# Altium schematic symbol library AA_Symbols.SchLib: 1017 symbols (part 7 of 7)
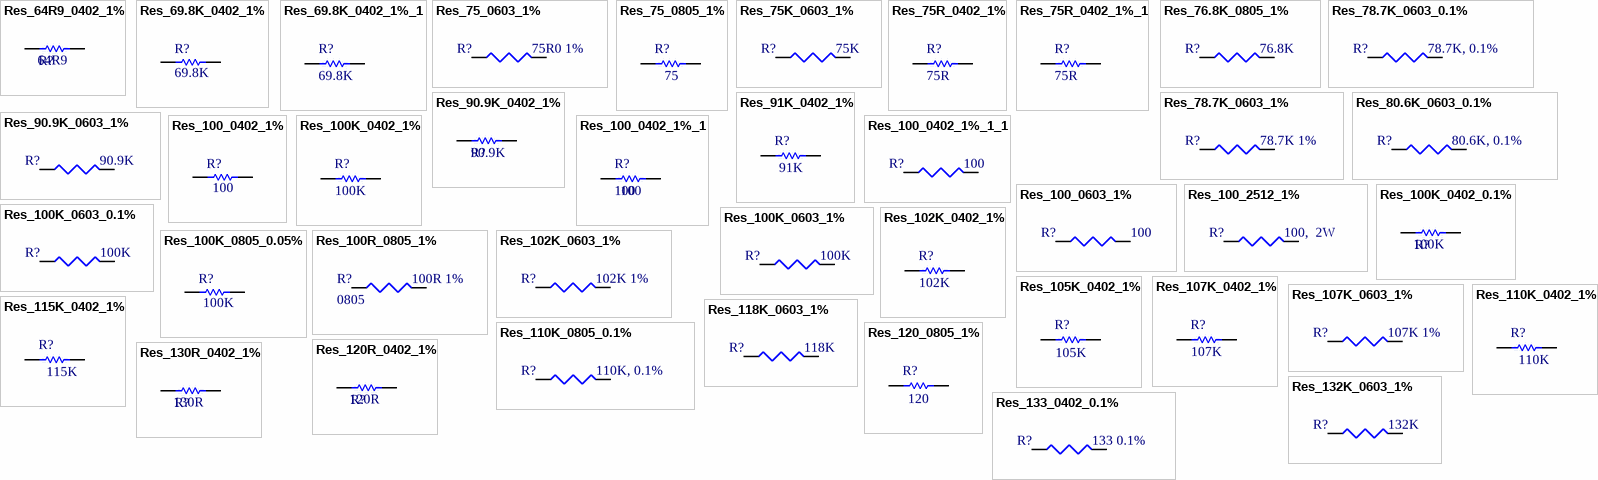
[diagram p48: symbols Res_64R9_0402_1% to Res_133_0402_0.1%]

## Res_118K_0603_1%
designator R?, comment 118K
Resistor, 118K, 0603, 1%; Manufacturer: Stackpole Electronics Inc; Manufacturer P/N: RMCF0603FT118K; Outset P/N: 0000243; Value: 118K
footprint RC_1608_0603_N
pins: 1, 2

## Res_120_0805_1%
designator R?, comment 120
Resistor, 120, 0805, 1%, 1/8W; Manufacturer P/N: ERJ-6ENF1200V; Manufacturer: Panasonic-ECG; Outset P/N: PN-0007121; TempCo: 100ppm/C; TOLERANCE: 1%; POWER: 1/8W; Value: 120
footprint RC_2012_0805_N
footprint RC_2012_0805_L
pins: 1, 2

## Res_120R_0402_1%
designator R?, comment 120R
Resistor, 120R, 0402, 1%, 1/16W; Manufacturer P/N: RC0402FR-07120RL; Manufacturer: Yageo; Outset P/N: PN-0008204; TempCo: 100ppm/C; TOLERANCE: 1%; POWER: 1/16W; Supplier 1: Digi-Key; Supplier Part Number 1: 311-120LRTR-ND; Value: 120R
footprint RC_1005_0402_L
pins: 1, 2

## Res_130R_0402_1%
designator R?, comment 130R
Resistor, 130R, 0402, 1%, 1/16W; Manufacturer P/N: RC0402FR-07130RL; Manufacturer: Yageo; Outset P/N: PN-0008205; TempCo: 100ppm/C; TOLERANCE: 1%; POWER: 1/16W; Supplier 1: Digi-Key; Supplier Part Number 1: 311-130LRTR-ND; Value: 130R
footprint RC_1005_0402_L
pins: 1, 2

## Res_132K_0603_1%
designator R?, comment 132K
Resistor, 132K, 0603, 1%; Manufacturer: Yageo; Manufacturer P/N: RT0603DRE07132KL; Outset P/N: PN-0003761; Value: 132K
footprint RC_1608_0603_N (Chip Resistor, 2-Leads, Body 1.5x0.8mm, IPC Medium Density)
pins: 1, 2

## Res_133_0402_0.1%
designator R?, comment 133 0.1%
Resistor, 133, 0402, 0.1%; Manufacturer: Yageo; Manufacturer P/N: RT0402BRD07133RL; Outset P/N: PN-0005554; Value: 133 0.1%
footprint RC_1005_0402_N (Chip Resistor, 2-Leads, Body 1.0x0.5mm, IPC Medium Density)
pins: 1, 2

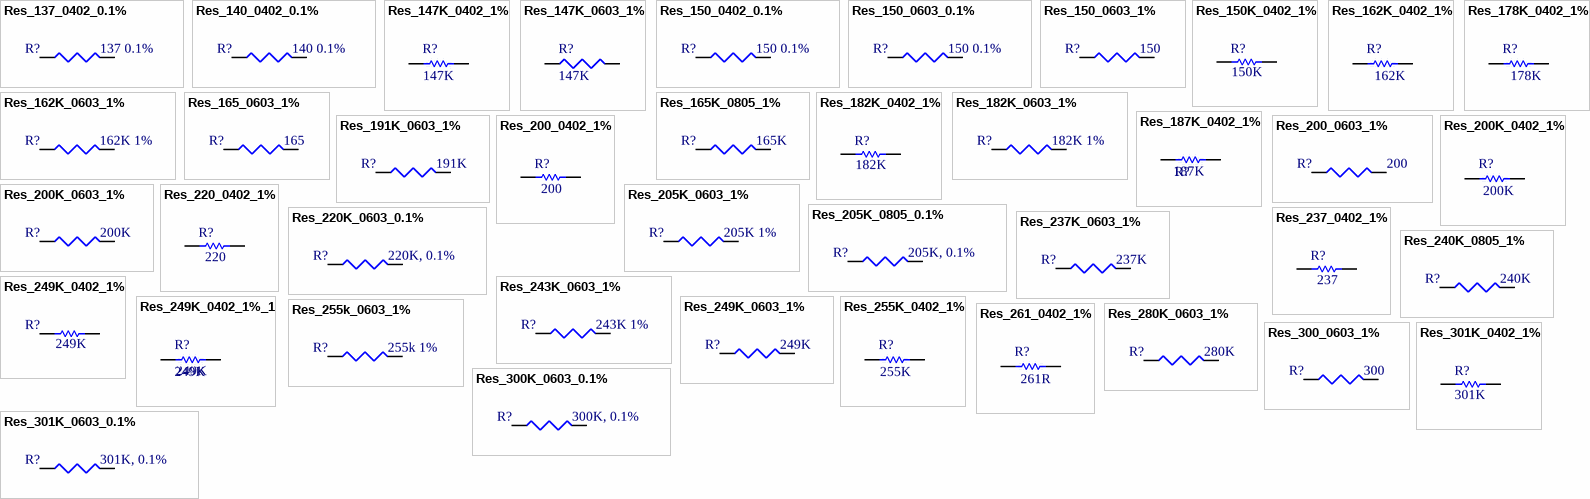
[diagram p37: symbols Res_137_0402_0.1% to Res_301K_0603_0.1%]

## Res_137_0402_0.1%
designator R?, comment 137 0.1%
Resistor, 137, 0402, 0.1%; Manufacturer: Panasonic; Manufacturer P/N: ERA-2AEB1370X; Outset P/N: PN-0005555; Value: 137 0.1%
footprint RC_1005_0402_N (Chip Resistor, 2-Leads, Body 1.0x0.5mm, IPC Medium Density)
pins: 1, 2

## Res_140_0402_0.1%
designator R?, comment 140 0.1%
Resistor, 140, 0402, 0.1%; Manufacturer: Yageo; Manufacturer P/N: RT0402BRD07140RL; Outset P/N: PN-0005755; Value: 140 0.1%
footprint RC_1005_0402_N (Chip Resistor, 2-Leads, Body 1.0x0.5mm, IPC Medium Density)
pins: 1, 2

## Res_147K_0402_1%
designator R?, comment 147K
Resistor, 147K, 0402, 1%, 1/10W; Manufacturer P/N: ERJ-2RKF1473X; Manufacturer: Panasonic-ECG; Outset P/N: PN-0007111; TempCo: 100ppm/C; TOLERANCE: 1%; POWER: 1/10W; Value: 147K
footprint RC_1005_0402_L
pins: 1, 2

## Res_147K_0603_1%
designator R?, comment 147K
Resistor, 147K, 0603, 1%; Manufacturer: Panasonic; Manufacturer P/N: ERJ-3EKF1473V; Outset P/N: PN-0000556; Value: 147K
footprint RC_1608_0603_N (Chip Resistor, 2-Leads, Body 1.5x0.8mm, IPC Medium Density)
pins: 1, 2

## Res_150_0402_0.1%
designator R?, comment 150 0.1%
Resistor, 150, 0402, 0.1%; Manufacturer: Panasonic; Manufacturer P/N: ERA-2AEB151X; Outset P/N: PN-0002073; Value: 150 0.1%
footprint RC_1005_0402_N (Chip Resistor, 2-Leads, Body 1.0x0.5mm, IPC Medium Density)
pins: 1, 2

## Res_150_0603_0.1%
designator R?, comment 150 0.1%
Resistor, 150, 0603, 0.1%; Manufacturer: Panasonic; Manufacturer P/N: ERA-3AEB151V; Outset P/N: 0000246; Value: 150 0.1%
footprint RC_1608_0603_N
pins: 1, 2

## Res_150_0603_1%
designator R?, comment 150
Resistor, 150, 0603, 1%; Manufacturer: Stackpole Electronics Inc; Manufacturer P/N: RMCF0603FT150R; Outset P/N: 0000247; Value: 150
footprint RC_1608_0603_N
pins: 1, 2

## Res_150K_0402_1%
designator R?, comment 150K
Resistor, 150K, 0402, 1%, 1/10W; Manufacturer P/N: ERJ-2RKF1503X; Manufacturer: Panasonic-ECG; Outset P/N: PN-0007248; TempCo: 100ppm/C; TOLERANCE: 1%; POWER: 1/10W; Value: 150K
footprint RC_1005_0402_L
footprint RC_1005_0402_N
pins: 1, 2

## Res_162K_0402_1%
designator R?, comment 162K
Resistor, 162K, 0402, 1%, 1/10W; Manufacturer P/N: ERJ-2RKF1623X; Manufacturer: Panasonic; Outset P/N: PN-0007190; TempCo: 100ppm/C; TOLERANCE: 1%; POWER: 1/10W; Value: 162K
footprint RC_1005_0402_L
pins: 1, 2

## Res_162K_0603_1%
designator R?, comment 162K 1%
Resistor, 162K, 0603, 1%; Manufacturer: Panasonic; Manufacturer P/N: ERJ-3EKF1623V; Outset P/N: PN-0001691; Value: 162K 1%
footprint RC_1608_0603_N (Chip Resistor, 2-Leads, Body 1.5x0.8mm, IPC Medium Density)
pins: 1, 2

## Res_165_0603_1%
designator R?, comment 165
Resistor, 165, 0603, 1%; Manufacturer: Stackpole Electronics Inc; Manufacturer P/N: RMCF0603FT165R; Outset P/N: 0000250; Value: 165
footprint RC_1608_0603_N
pins: 1, 2

## Res_165K_0805_1%
designator R?, comment 165K
Resistor, 165K, 0805, 1%; Manufacturer: Panasonic; Manufacturer P/N: ERJ-6ENF1653V; Outset P/N: PN-0003758; Value: 165K
footprint RC_2012_0805_N (Chip Resistor, 2-Leads, Body 2.0x1.3mm, IPC Medium Density)
pins: 1, 2

## Res_178K_0402_1%
designator R?, comment 178K
Resistor, 178K, 0402, 1%, 1/16W; Manufacturer P/N: RC0402FR-07178KL; Manufacturer: YAGEO; Outset P/N: PN-0008206; TempCo: 100ppm/C; TOLERANCE: 1%; POWER: 1/16W; Value: 178K
footprint RC_1005_0402_L
pins: 1, 2

## Res_182K_0402_1%
designator R?, comment 182K
Resistor, 182K, 0402, 1%, 1/10W; Manufacturer P/N: ERJ-2RKF1823X; Manufacturer: Panasonic-ECG; Outset P/N: PN-0007249; TempCo: 100ppm/C; TOLERANCE: 1%; POWER: 1/10W; Value: 182K
footprint RC_1005_0402_L
footprint RC_1005_0402_N
pins: 1, 2

## Res_182K_0603_1%
designator R?, comment 182K 1%
Resistor, 182K, 0603, 1%; Manufacturer: Panasonic; Manufacturer P/N: ERJ-3EKF1823V; Outset P/N: PN-0001693; Value: 182K 1%
footprint RC_1608_0603_N (Chip Resistor, 2-Leads, Body 1.5x0.8mm, IPC Medium Density)
pins: 1, 2

## Res_187K_0402_1%
designator R?, comment 187K
Resistor, 187K, 0402, 1%, 1/10W; Manufacturer P/N: ERJ-2RKF1873X; Manufacturer: Panasonic; Outset P/N: PN-0008343; TempCo: 100ppm/C; TOLERANCE: 1%; POWER: 1/10W; Value: 187K
footprint RC_1005_0402_L
pins: 1, 2

## Res_191K_0603_1%
designator R?, comment 191K
Resistor, 191K, 0603, 1%; Manufacturer: Stackpole; Manufacturer P/N: RMCF0603FT191K; Outset P/N: 0000251; Value: 191K
footprint RC_1608_0603_N
pins: 1, 2

## Res_200_0402_1%
designator R?, comment 200
Resistor, 200, 0402, 1%, 1/10W; Manufacturer P/N: ERJ-2RKF2000X; Manufacturer: Panasonic-ECG; Outset P/N: PN-0007229; TempCo: 100ppm/C; POWER: 1/10W; TOLERANCE: 1%; Value: 200
footprint RC_1005_0402_L
footprint RC_1005_0402_N
pins: 1, 2

## Res_200_0603_1%
designator R?, comment 200
Resistor, 200, 0603, 1%; Manufacturer: Stackpole Electronics Inc; Manufacturer P/N: RMCF0603FT200R; Outset P/N: 0000259; Value: 200
footprint RC_1608_0603_N
pins: 1, 2

## Res_200K_0402_1%
designator R?, comment 200K
Resistor, 200K, 0402, 1%, 1/16W; Manufacturer P/N: RMCF0402FT200K; Manufacturer: Yageo; Outset P/N: PN-0008346; TempCo: 100ppm/C; TOLERANCE: 1%; POWER: 1/16W; Value: 200K
footprint RC_1005_0402_L
pins: 1, 2

## Res_200K_0603_1%
designator R?, comment 200K
Resistor, 200K, 0603, 1%; Manufacturer: Stackpole Electronics Inc; Manufacturer P/N: RMCF0603FT200K; Outset P/N: 0000258; Value: 200K
footprint RC_1608_0603_N
pins: 1, 2

## Res_205K_0603_1%
designator R?, comment 205K 1%
Resistor, 205K, 0603, 1%; Manufacturer: Panasonic; Manufacturer P/N: ERJ-3EKF2053V; Outset P/N: PN-0001779; Value: 205K 1%
footprint RC_1608_0603_N (Chip Resistor, 2-Leads, Body 1.5x0.8mm, IPC Medium Density)
pins: 1, 2

## Res_205K_0805_0.1%
designator R?, comment 205K, 0.1%
Resistor, 205K, 0805, 0.1%; Manufacturer: Panasonic Electronic Components; Manufacturer P/N: ERA-6AEB2053V; Outset P/N: 0000260; Value: 205K, 0.1%
footprint RC_2012_0805_N
pins: 1, 2

## Res_220_0402_1%
designator R?, comment 220
Resistor, 220, 0402, 1%, 1/10W; Manufacturer P/N: ERJ-2RKF2200X; Manufacturer: Panasonic-ECG; Outset P/N: PN-0007230; TempCo: 100ppm/C; TOLERANCE: 1%; POWER: 1/10W; Value: 220
footprint RC_1005_0402_L
footprint RC_1005_0402_N
pins: 1, 2

## Res_220K_0603_0.1%
designator R?, comment 220K, 0.1%
Resistor, 220K, 0603, 0.1%; Manufacturer: Panasonic Electronic Components; Manufacturer P/N: ERA-3AEB224V; Outset P/N: 0000263; Value: 220K, 0.1%
footprint RC_1608_0603_N
pins: 1, 2

## Res_237_0402_1%
designator R?, comment 237
Resistor, 237R, 0402, 1%, 1/10W; Manufacturer P/N: ERJ-2RKF2370X; Manufacturer: Panasonic-ECG; TempCo: 100ppm/C; Outset P/N: *; TOLERANCE: 1%; POWER: 1/10W; Value: 237
footprint RC_1005_0402_L
footprint RC_1005_0402_N
pins: 1, 2

## Res_237K_0603_1%
designator R?, comment 237K
Resistor, 237K, 0603, 1%; Manufacturer: Stackpole; Manufacturer P/N: RMCF0603FT237K; Outset P/N: 0000264; Value: 237K
footprint RC_1608_0603_N
pins: 1, 2

## Res_240K_0805_1%
designator R?, comment 240K
Resistor, 240K, 0805, 1%; Manufacturer: Panasonic; Manufacturer P/N: ERJ-6ENF2403V; Outset P/N: PN-0003753; Value: 240K
footprint RC_2012_0805_N (Chip Resistor, 2-Leads, Body 2.0x1.3mm, IPC Medium Density)
pins: 1, 2

## Res_243K_0603_1%
designator R?, comment 243K 1%
Resistor, 243K, 0603, 1%; Manufacturer: Panasonic; Manufacturer P/N: ERJ-3EKF2433V; Outset P/N: PN-0001719; Value: 243K 1%
footprint RC_1608_0603_N (Chip Resistor, 2-Leads, Body 1.5x0.8mm, IPC Medium Density)
pins: 1, 2

## Res_249K_0402_1%
designator R?, comment 249K
Resistor, 249K, 0402, 1%, 1/10W; Manufacturer P/N: ERJ-2RKF2493X; Manufacturer: Panasonic-ECG; Outset P/N: PN-0007250; TempCo: 100ppm/C; TOLERANCE: 1%; POWER: 1/10W; Value: 249K
footprint RC_1005_0402_L
footprint RC_1005_0402_N
pins: 1, 2

## Res_249K_0402_1%_1
designator R?, comment 249K
Resistor, 249K, 0402, 1%, 1/10W; Manufacturer P/N: ERJ-2RKF2493X; Manufacturer: Panasonic-ECG; Outset P/N: PN-0007112; TempCo: 100ppm/C; TOLERANCE: 1%; POWER: 1/10W; Value: 249K
footprint RC_1005_0402_L
pins: 1, 2

## Res_249K_0603_1%
designator R?, comment 249K
Resistor, 249K, 0603, 1%; Manufacturer: Vishay Dale; Manufacturer P/N: CRCW0603249KFKEA; Outset P/N: 0000266; Value: 249K
footprint RC_1608_0603_N
pins: 1, 2

## Res_255K_0402_1%
designator R?, comment 255K
Resistor, 255K, 0402, 1%, 1/10W; Manufacturer P/N: ERJ-2RKF2553X; Manufacturer: Panasonic-ECG; Outset P/N: PN-0007113; TempCo: 100ppm/C; TOLERANCE: 1%; POWER: 1/10W; Value: 255K
footprint RC_1005_0402_L
pins: 1, 2

## Res_255k_0603_1%
designator R?, comment 255k 1%
Resistor, 255k, 0603, 1%; Manufacturer: Stackpole; Manufacturer P/N: RMCF0603FT255K; Outset P/N: PN-0001768; Value: 255k 1%
footprint RC_1608_0603_N (Chip Resistor, 2-Leads, Body 1.5x0.8mm, IPC Medium Density)
pins: 1, 2

## Res_261_0402_1%
designator R?, comment 261R
Resistor, 261R, 0402, 1%, 1/10W; Manufacturer P/N: ERJ-2RKF2610X; Manufacturer: Panasonic; Outset P/N: PN-0008277; TempCo: 100ppm/C; TOLERANCE: 1%; POWER: 1/10W; Value: 261R
footprint RC_1005_0402_L
pins: 1, 2

## Res_280K_0603_1%
designator R?, comment 280K
Resistor, 280K, 0603, 1%; Manufacturer: Stackpole; Manufacturer P/N: RMCF0603FT280K; Outset P/N: 0000271; Value: 280K
footprint RC_1608_0603_N
pins: 1, 2

## Res_300_0603_1%
designator R?, comment 300
Resistor, 300, 0603, 1%; Manufacturer: Stackpole Electronics Inc; Manufacturer P/N: RMCF0603FT300R; Outset P/N: 0000278; Value: 300
footprint RC_1608_0603_N
pins: 1, 2

## Res_300K_0603_0.1%
designator R?, comment 300K, 0.1%
Resistor, 300K, 0603, 0.1%; Manufacturer: Panasonic - ERA; Manufacturer P/N: ERA-3AEB304V; Outset P/N: 0000277; Value: 300K, 0.1%
footprint RC_1608_0603_N
pins: 1, 2

## Res_301K_0402_1%
designator R?, comment 301K
Resistor, 301K, 0402, 1%, 1/10W; Manufacturer P/N: ERJ-2RKF3013X; Manufacturer: Panasonic Electronic Components; Outset P/N: PN-0007453; TempCo: 100ppm/C; TOLERANCE: 1%; POWER: 1/10W; Value: 301K
footprint RC_1005_0402_L
footprint RC_1005_0402_N
pins: 1, 2

## Res_301K_0603_0.1%
designator R?, comment 301K, 0.1%
Resistor, 301K, 0603, 0.1%; Manufacturer: Susumu; Manufacturer P/N: RG1608P-3013-B-T5; Value: 301K, 0.1%
footprint RC_1608_0603_N
pins: 1, 2

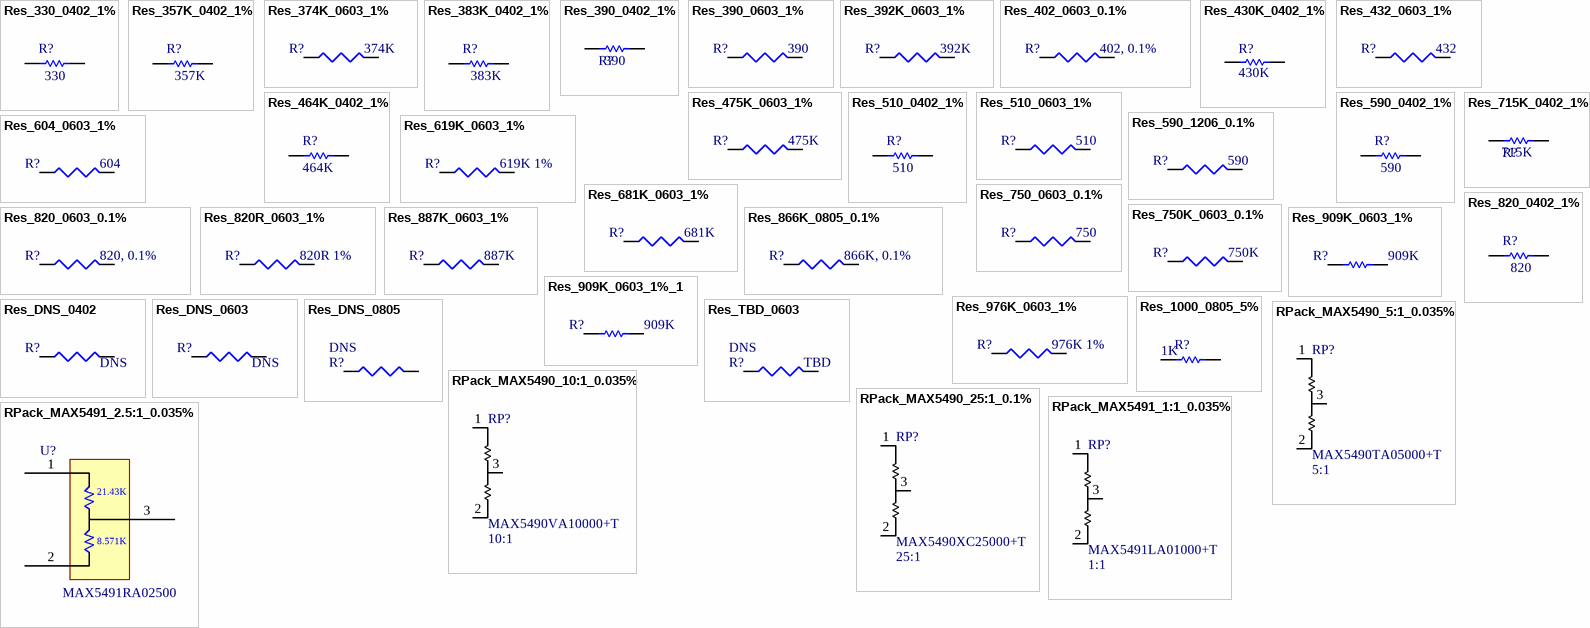
[diagram p38: symbols Res_330_0402_1% to RPack_MAX5491_2.5:1_0.035%]

## Res_330_0402_1%
designator R?, comment 330
Resistor, 330, 0402, 1%, 1/10W; Manufacturer P/N: ERJ-2RKF3300X; Manufacturer: Panasonic; Outset P/N: PN-0007062; TempCo: 100ppm/C; TOLERANCE: 1%; POWER: 1/10W; Value: 330
footprint RC_1005_0402_L
pins: 1, 2

## Res_357K_0402_1%
designator R?, comment 357K
Resistor, 357K, 0402, 1%, 1/10W; Manufacturer P/N: ERJ-2RKF3573X; Manufacturer: Panasonic; Outset P/N: PN-0007191; TempCo: 100ppm/C; TOLERANCE: 1%; POWER: 1/10W; Value: 357K
footprint RC_1005_0402_L
pins: 1, 2

## Res_374K_0603_1%
designator R?, comment 374K
Resistor, 374K, 0603, 1%; Manufacturer: Yageo; Manufacturer P/N: RC0603FR-07374KL; Outset P/N: 0000283; Value: 374K
footprint RC_1608_0603_N
pins: 1, 2

## Res_383K_0402_1%
designator R?, comment 383K
Resistor, 383K, 0402, 1%, 1/16W; Manufacturer P/N: RC0402FR-07383KL; Manufacturer: YAGEO; Outset P/N: PN-0008207; TempCo: 100ppm/C; TOLERANCE: 1%; POWER: 1/16W; Value: 383K
footprint RC_1005_0402_L
pins: 1, 2

## Res_390_0402_1%
designator R?, comment 390
Resistor, 390, 0402, 1%, 1/10W; Manufacturer P/N: ERJ-2RKF3900X; Manufacturer: Panasonic; Outset P/N: PN-0007063; TempCo: 100ppm/C; TOLERANCE: 1%; POWER: 1/10W; Value: 390
footprint RC_1005_0402_L
pins: 1, 2

## Res_390_0603_1%
designator R?, comment 390
Resistor, 390, 0603, 1%; Manufacturer: Stackpole; Manufacturer P/N: RMCF0603FT390R; Outset P/N: 0000284; Value: 390
footprint RC_1608_0603_N
pins: 1, 2

## Res_392K_0603_1%
designator R?, comment 392K
Resistor, 392K, 0603, 1%; Manufacturer: Stackpole Electronics Inc; Manufacturer P/N: RMCF0603FT392K; Outset P/N: 0000285; Value: 392K
footprint RC_1608_0603_N
pins: 1, 2

## Res_402_0603_0.1%
designator R?, comment 402, 0.1%
Resistor, 402, 0603, 0.1%; Manufacturer: Susumu; Manufacturer P/N: RG1608P-4020-B-T5; Outset P/N: 0000291; Value: 402, 0.1%
footprint RC_1608_0603_N
pins: 1, 2

## Res_430K_0402_1%
designator R?, comment 430K
Resistor, 430K, 0402, 1%, 1/10W; Manufacturer P/N: ERJ-2RKF4303X; Manufacturer: Panasonic-ECG; Outset P/N: PN-0007260; TempCo: 100ppm/C; TOLERANCE: 1%; POWER: 1/10W; Value: 430K
footprint RC_1005_0402_L
footprint RC_1005_0402_N
pins: 1, 2

## Res_432_0603_1%
designator R?, comment 432
Resistor, 432, 0603, 1%; Manufacturer: Panasonic Electronic Components; Manufacturer P/N: ERJ-3EKF4320V; Outset P/N: 0000292; Value: 432
footprint RC_1608_0603_N
pins: 1, 2

## Res_464K_0402_1%
designator R?, comment 464K
Resistor, 464K, 0402, 1%, 1/10W; Manufacturer P/N: ERJ-2RKF4643X; Manufacturer: Panasonic-ECG; Outset P/N: PN-0007114; TempCo: 100ppm/C; TOLERANCE: 1%; POWER: 1/10W; Value: 464K
footprint RC_1005_0402_L
pins: 1, 2

## Res_475K_0603_1%
designator R?, comment 475K
Resistor, 475K, 0603, 1%; Manufacturer: Stackpole Electronics Inc; Manufacturer P/N: RMCF0603FT475K; Outset P/N: 0000293; Value: 475K
footprint RC_1608_0603_N
pins: 1, 2

## Res_510_0402_1%
designator R?, comment 510
Resistor, 510, 0402, 1%, 1/10W; Manufacturer P/N: ERJ-2RKF5100X; Manufacturer: Panasonic; Outset P/N: PN-0007064; TempCo: 100ppm/C; TOLERANCE: 1%; POWER: 1/10W; Value: 510
footprint RC_1005_0402_L
pins: 1, 2

## Res_510_0603_1%
designator R?, comment 510
Resistor, 510, 0603, 1%; Manufacturer: Stackpole; Manufacturer P/N: RMCF0603FT510R; Outset P/N: 0000296; Value: 510
footprint RC_1608_0603_N
pins: 1, 2

## Res_590_0402_1%
designator R?, comment 590
Resistor, 590, 0402, 1%, 1/16W; Manufacturer P/N: AC0402FR-07590RL; Manufacturer: Yageo; Outset P/N: PN-0007055; TempCo: 100ppm/C; POWER: 1/16W; TOLERANCE: 1%; TYPE: Thick Film Chip Resistor; VALUE: 590
footprint RC_1005_0402_L
pins: 1, 2

## Res_590_1206_0.1%
designator R?, comment 590
Resistor, 590, 1206, 0.1%, 0.4W; Manufacturer: TE Connectivity; Manufacturer P/N: RQ73C2B590RBTD; Outset P/N: PN-0007427; Tolerance: 0.1%; Value: 590
footprint RC_3216_1206_N
pins: 1, 2

## Res_604_0603_1%
designator R?, comment 604
Resistor, 604, 0603, 1%; Manufacturer: Stackpole; Manufacturer P/N: RMCF0603FT604R; Outset P/N: 0000300; Value: 604
footprint RC_1608_0603_N
pins: 1, 2

## Res_619K_0603_1%
designator R?, comment 619K 1%
Resistor, 619K, 0603, 1%; Manufacturer: Panasonic; Manufacturer P/N: ERJ3EKF6193V; Outset P/N: PN-0002766; Value: 619K 1%
footprint RC_1608_0603_N (Chip Resistor, 2-Leads, Body 1.5x0.8mm, IPC Medium Density)
pins: 1, 2

## Res_681K_0603_1%
designator R?, comment 681K
Resistor, 681K, 0603, 1%; Manufacturer: Stackpole Electronics Inc; Manufacturer P/N: RMCF0603FT681K; Outset P/N: 0000302; Value: 681K
footprint RC_1608_0603_N
pins: 1, 2

## Res_715K_0402_1%
designator R?, comment 715K
Resistor, 715K, 0402, 1%, 1/16W; Manufacturer P/N: RC0402FR-07715KL; Manufacturer: Yageo; Outset P/N: PN-0008208; TempCo: 100ppm/C; TOLERANCE: 1%; POWER: 1/16W; Supplier 1: Digi-Key; Supplier Part Number 1: YAG3221TR-ND; Value: 715K
footprint RC_1005_0402_L
pins: 1, 2

## Res_750_0603_0.1%
designator R?, comment 750
Resistor, 750, 0603, 0.1%, 0.15W; Manufacturer: TE Connectivity; Manufacturer P/N: RQ73C1J750RBTD; TempCo: 10ppm/C; Outset P/N: PN-0008325; POWER: 0.15W; TOLERANCE: 0.1%; Value: 750
footprint RC_1608_0603_L (Chip Resistor, 2-Leads, Body 1.5x0.8mm, IPC Least Density)
pins: 1, 2

## Res_750K_0603_0.1%
designator R?, comment 750K
Resistor, 750K, 0603, 0.1%, 1/16W; Manufacturer: TE Connectivity; Manufacturer P/N: CPF0603B750KE1; TempCo: 25ppm/C; Outset P/N: PN-0008323; POWER: 1/16W; TOLERANCE: 0.1%; Value: 750K
footprint RC_1608_0603_L (Chip Resistor, 2-Leads, Body 1.5x0.8mm, IPC Least Density)
pins: 1, 2

## Res_820_0402_1%
designator R?, comment 820
Resistor, 820, 0402, 1%, 1/10W; Manufacturer P/N: ERJ-2RKF8200X; Manufacturer: Panasonic; Outset P/N: PN-0007173; TempCo: 100ppm/C; TOLERANCE: 1%; POWER: 1/10W; Value: 820
footprint RC_1005_0402_L
pins: 1, 2

## Res_820_0603_0.1%
designator R?, comment 820, 0.1%
Resistor, 820, 0603, 0.1%; Manufacturer: Panasonic - ECG; Manufacturer P/N: ERA-3AEB821V; Outset P/N: 0000308; Value: 820, 0.1%
footprint RC_1608_0603_N
pins: 1, 2

## Res_820R_0603_1%
designator R?, comment 820R 1%
Resistor, 820R, 0603, 1%; Manufacturer: Stackpole; Manufacturer P/N: RMCF0603FT820R; Outset P/N: PN-0001757; Value: 820R 1%
footprint RC_1608_0603_N (Chip Resistor, 2-Leads, Body 1.5x0.8mm, IPC Medium Density)
pins: 1, 2

## Res_866K_0805_0.1%
designator R?, comment 866K, 0.1%
Resistor, 866K, 0805, 0.1%; Manufacturer: Panasonic Electronic Components; Manufacturer P/N: ERA-6AEB8663V; Outset P/N: 0000309; Value: 866K, 0.1%
footprint RC_2012_0805_N
pins: 1, 2

## Res_887K_0603_1%
designator R?, comment 887K
Resistor, 887K, 0603, 1%; Manufacturer: Stackpole; Manufacturer P/N: RMCF0603FT887K; Outset P/N: 0000310; Value: 887K
footprint RC_1608_0603_N
pins: 1, 2

## Res_909K_0603_1%
designator R?, comment 909K
Resistor, 909KOhms, 0603, 1%; Manufacturer: Panasonic Electronic Components; Manufacturer P/N: ERJ-3EKF9093V; Outset P/N: PN-0008390; Value: 909K
footprint RC_1608_0603_N (Chip Resistor, 2-Leads, Body 1.5x0.8mm, IPC Medium Density)
pins: 1, 2

## Res_909K_0603_1%_1
designator R?, comment 909K
Resistor, 909KOhms, 0603, 1%; Manufacturer: Panasonic Electronic Components; Manufacturer P/N: ERJ-3EKF9093V; Value: 909K
footprint RC_1608_0603_N (Chip Resistor, 2-Leads, Body 1.5x0.8mm, IPC Medium Density)
pins: 1, 2

## Res_976K_0603_1%
designator R?, comment 976K 1%
Resistor, 976K, 0603, 1%; Manufacturer: Panasonic; Manufacturer P/N: ERJ-3EKF9763V; Outset P/N: PN-0001692; Value: 976K 1%
footprint RC_1608_0603_N (Chip Resistor, 2-Leads, Body 1.5x0.8mm, IPC Medium Density)
pins: 1, 2

## Res_1000_0805_5%
designator R?, comment 1K
Resistor, 1000R, 0805, 5%, 1/2W; Manufacturer P/N: ERJ-P06J102V; Manufacturer: Panasonic-ECG; TempCo: 200ppm/C; TOLERANCE: 5%; Supplier 1: Mouser; Supplier Part Number 1: 667-ERJ-P06J102V; POWER: 1/2W; Value: 1K
footprint RC_2012_0805_N
footprint RC_2012_0805_L
pins: 1, 2

## Res_DNS_0402
designator R?, comment DNS
Resistor, DNS, 0402; Manufacturer: N/A; Manufacturer P/N: N/A; Value: DNS; NOSTUFF: DNS
footprint RC_1005_0402_N (Chip Resistor, 2-Leads, Body 1.0x0.5mm, IPC Medium Density)
pins: 1, 2

## Res_DNS_0603
designator R?, comment DNS
Resistor, DNS, 0603; Outset P/N: 0000314; Manufacturer: N/A; Manufacturer P/N: N/A; Value: DNS; NOSTUFF: DNS
footprint RC_1608_0603_N
pins: 1, 2

## Res_DNS_0805
designator R?, comment DNS
Resistor, DNS, 0805; Outset P/N: PN-0002792; Manufacturer: N/A; Manufacturer P/N: N/A; Value: DNS; NOSTUFF: DNS
footprint RC_2012_0805_N (Chip Resistor, 2-Leads, Body 2.0x1.3mm, IPC Medium Density)
pins: 1, 2

## Res_TBD_0603
designator R?, comment NOSTUFF: DNS  (hidden comment: TBD)
Resistor, TBD, 0603; Outset P/N: 0000315; Value: TBD
footprint RC_1608_0603_N
pins: 1, 2

## RPack_MAX5490_5:1_0.035%
designator RP?, comment MAX5490TA05000+T  value 5:1
Resistor Pack, MAX5490, 5:1, 0.035%; Manufacturer: Maxim; Outset P/N: 0000201; Manufacturer P/N: MAX5490TA05000+T
footprint SOT-23 (SOT-23; 3 Leads; Body 3.0 x 2.6 mm, inc. leads (LxW max))
pins: 1 P1, 2 P2, 3 P3

## RPack_MAX5490_10:1_0.035%
designator RP?, comment MAX5490VA10000+T  value 10:1
Resistor Pack, MAX5490, 10:1, 0.035%; Manufacturer: Maxim; Outset P/N: 0000199; Manufacturer P/N: MAX5490VA10000+T
footprint SOT-23 (SOT-23; 3 Leads; Body 3.0 x 2.6 mm, inc. leads (LxW max))
pins: 1 P1, 2 P2, 3 P3

## RPack_MAX5490_25:1_0.1%
designator RP?, comment MAX5490XC25000+T  value 25:1
Resistor Pack, MAX5490, 25:1, 0.1%; Manufacturer: Maxim; Outset P/N: 0000200; Manufacturer P/N: MAX5490XC25000+T
footprint SOT-23 (SOT-23; 3 Leads; Body 3.0 x 2.6 mm, inc. leads (LxW max))
pins: 1 P1, 2 P2, 3 P3

## RPack_MAX5491_1:1_0.035%
designator RP?, comment MAX5491LA01000+T  value 1:1
Resistor Pack, MAX5491, 1:1, 0.035%; Manufacturer: Maxim; Outset P/N: 0000202; Manufacturer P/N: MAX5491LA01000+T
footprint SOT-23 (SOT-23; 3 Leads; Body 3.0 x 2.6 mm, inc. leads (LxW max))
pins: 1 P1, 2 P2, 3 P3

## RPack_MAX5491_2.5:1_0.035%
designator U?, comment MAX5491RA02500
Resistor Pack, MAX54918, 2.5:1, 0.035%, SOT-23; Manufacturer: Maxim; Manufacturer P/N: MAX5491RA02500+T; Outset P/N: PN-0003020
footprint SOT-23 (SOT-23; 3 Leads; Body 3.0 x 2.6 mm, inc. leads (LxW max))
pins: 1 P1, 2 P2, 3 P3
text: 21.43K; 8.571K

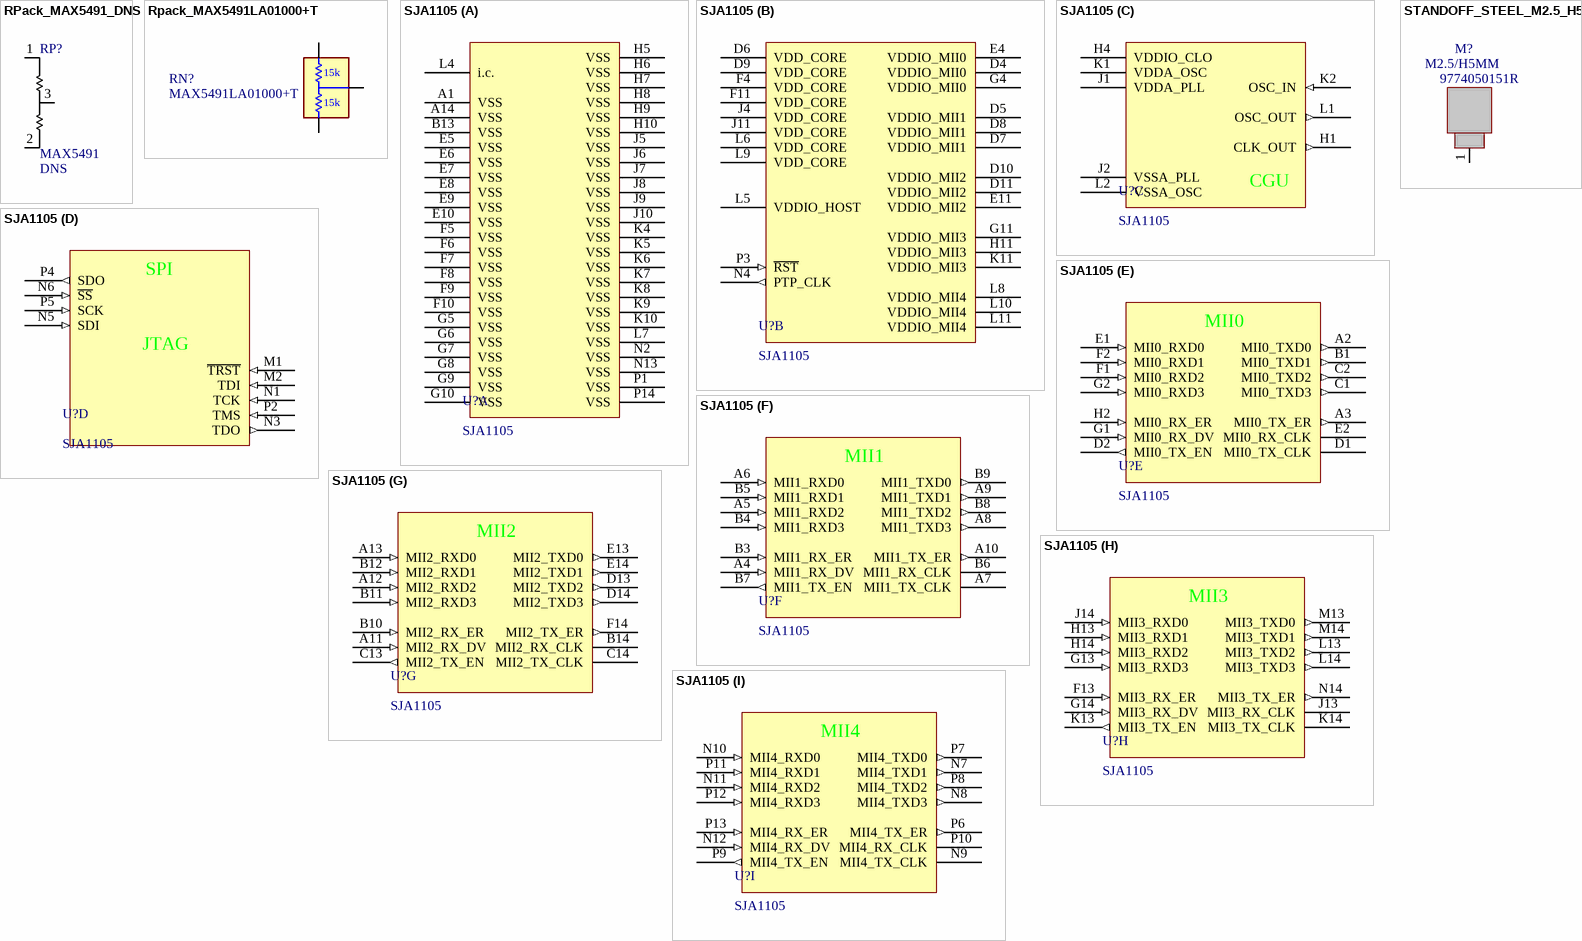
[diagram p39: symbols RPack_MAX5491_DNS to STANDOFF_STEEL_M2.5_H5MM]

## RPack_MAX5491_DNS
designator RP?, comment MAX5491  NOSTUFF: DNS
Resistor Pack, MAX5491, DNS; Outset P/N: 0000203; Manufacturer: N/A; Manufacturer P/N: N/A; Value: DNS
footprint SOT-23 (SOT-23; 3 Leads; Body 3.0 x 2.6 mm, inc. leads (LxW max))
pins: 1 P1, 2 P2, 3 P3

## Rpack_MAX5491LA01000+T
designator RN?, comment MAX5491LA01000+T
RES NTWRK 2 RES 15K OHM TO236-3; POWER: 87.5mW; TOLERANCE: 0.035%; MFG: Maxim Integrated; Outset P/N: 0000202; TEMPERATURE: -40°C ~ 85°C; VALUE: MAX5491LA01000+T; MFG_PART_NO: MAX5491LA01000+T
footprint SOT23-3P95_230X110L30X43N (TO-236AB)
pins: 1 P1, 2 P2, 3 P3
text: 15k
